# Altium footprint library My_SOMA_1806211.PcbLib: 50 footprints (part 2 of 4)
Each footprint in its own frame and in the unit in brackets; x right, y up, seen from the top. Pads: shape width x height; smd on the part's side, far side on the other; paste and mask are expansions set on the pad; w line width, h text height; cw(c..) or ccw(c..) is an arc to the next point about the centre after c.
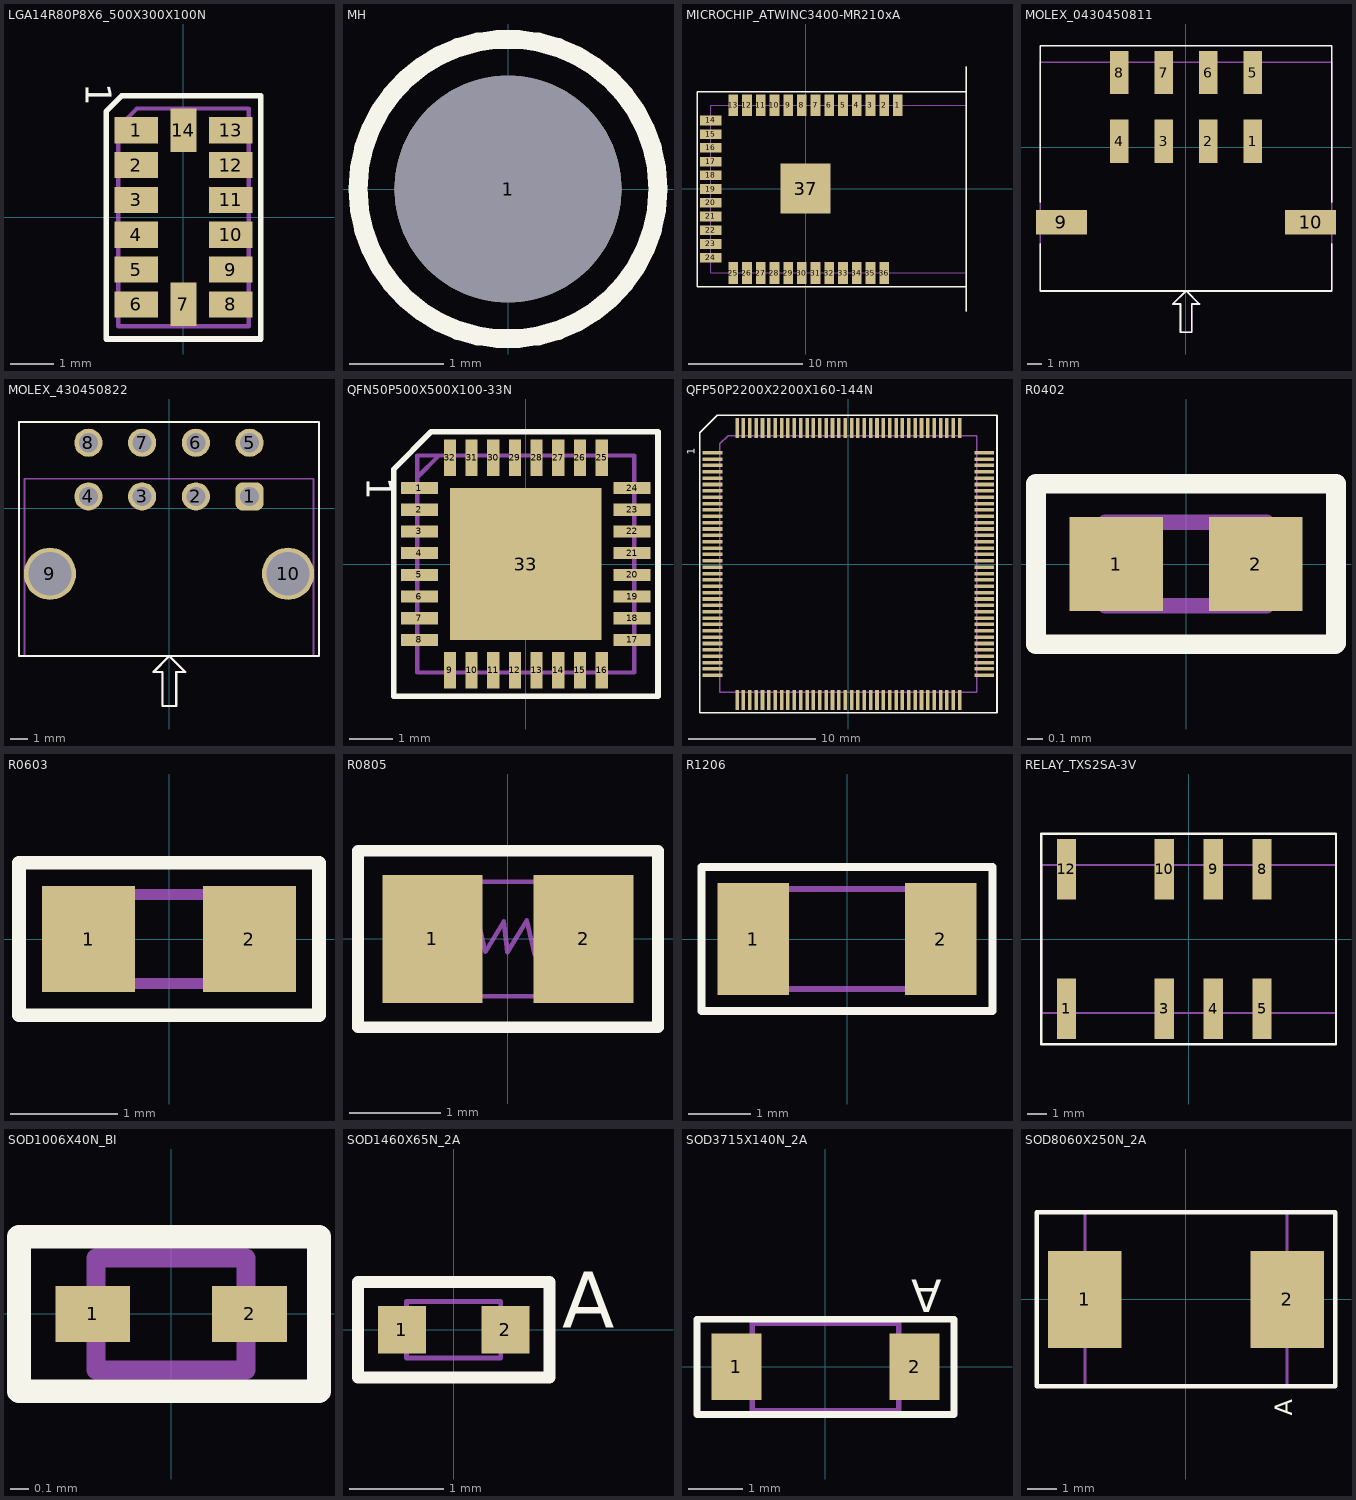
[diagram p1: the footprints below, top view; thin cyan lines are the x and y axes]

## LGA14R80P8X6_500X300X100N [mm] "ADXL343BCCZ-RL7,ACCEL 2-16G I2C/SPI 14LGA"
height 1
pads (14):
  rect 1x0.6 smd mask+0.051: 1(-1.086,2) 2(-1.086,1.2) 3(-1.086,0.4) 4(-1.086,-0.4) 5(-1.086,-1.2) 6(-1.086,-2) 8(1.086,-2) 9(1.086,-1.2) 10(1.086,-0.4) 11(1.086,0.4) 12(1.086,1.2) 13(1.086,2)
  rect 0.6x1 smd mask+0.051: 7(0,-2) 14(0,2)
Top Overlay:
  lines w0.127: -1.778,-2.794 -1.778,2.428 -1.412,2.794 1.778,2.794 1.778,-2.794 -1.778,-2.794
  text "1" at -2.442,3.08 h1.02
Mechanical 13:
  lines w0.102: -1.5,-2.5 -1.5,2.068 -1.068,2.5 1.5,2.5 1.5,-2.5 -1.5,-2.5
  text ".Designator" at -0.077,0.572 h1.02
  text "1" at -1.233,2.062 h1.02
3D body "LGA_CC-14-1_ADI.step": height 1.02, standoff 0, extent -1.625,-2.5 1.625,2.5

## MH [mm]
pads (1):
  round 2.4 hole 2.4 unplated: 1(0,0)
Top Overlay:
  circle w0.2: c0,0 r1.585
Mechanical 13:
  circle w0.102: c0,0 r1.585

## MICROCHIP_ATWINC3400-MR210xA [mm] "ATWINC3400-MR210xA"
height 2
pads (37):
  rect 0.85x1.905 smd mask+0.051: 1(8.105,7.318) 2(6.901,7.318) 3(5.697,7.318) 4(4.493,7.318) 5(3.289,7.318) 6(2.085,7.318) 7(0.881,7.318) 8(-0.323,7.318) 9(-1.527,7.318) 10(-2.731,7.318) 11(-3.935,7.318) 12(-5.139,7.318) 13(-6.343,7.318) 25(-6.343,-7.414) 26(-5.139,-7.414) 27(-3.935,-7.414) 28(-2.731,-7.414) 29(-1.527,-7.414) 30(-0.323,-7.414) 31(0.881,-7.414) 32(2.085,-7.414) 33(3.289,-7.414) 34(4.493,-7.414) 35(5.697,-7.414) 36(6.901,-7.414)
  rect 1.905x0.85 smd mask+0.051: 14(-8.328,5.974) 15(-8.328,4.77) 16(-8.328,3.566) 17(-8.328,2.362) 18(-8.328,1.158) 19(-8.328,-0.046) 20(-8.328,-1.25) 21(-8.328,-2.454) 22(-8.328,-3.658) 23(-8.328,-4.862) 24(-8.328,-6.066)
  rect 4.4x4.4 smd mask+0.051: 37(0,0)
Top Overlay:
  lines w0.127: 14.104,-10.751 14.104,-7.407 ; 14.104,7.325 14.104,10.668 ; -9.525,-8.636 -9.525,8.509 14.104,8.509 14.104,-8.636 -9.525,-8.636
Mechanical 13:
  lines w0.102: 14.104,-10.751 14.104,-7.407 ; 14.104,10.668 14.104,7.325 ; 14.104,-7.407 14.104,7.325 ; 14.104,-7.407 -8.324,-7.407 -8.324,7.325 14.104,7.325
  text "PCB EDGE" at 14.72,11.303 h1.02
  text ".Designator" at -0.975,0.539 h1.02
3D body "ATWINC3400-MR210CA131.STEP": height 2.19, standoff -0.02, extent -8.324,-7.408 14.102,7.324

## MOLEX_0430450811 [mm] "0430450811,CONN HEADER SMD R/A 8POS 3MM"
height 8
pads (10):
  rect 1.27x2.921 smd mask+0.051: 1(4.5,0.42) 2(1.5,0.42) 3(-1.5,0.42) 4(-4.5,0.42) 5(4.5,5.05) 6(1.5,5.05) 7(-1.5,5.05) 8(-4.5,5.05)
  rect 3.43x1.65 smd mask+0.051: 9(-8.395,-5.05) 10(8.395,-5.05)
Top Overlay:
  lines w0.127: -9.825,-6.507 -9.825,-9.669 9.825,-9.669 9.825,-6.507 ; -9.825,-3.671 -9.825,6.858 9.825,6.858 9.825,-3.671 ; -0.374,-10.549 -0.88,-10.549 0.009,-9.66 0.898,-10.549 0.39,-10.549 0.39,-12.454 -0.372,-12.454 -0.372,-10.549
Mechanical 13:
  lines w0.102: -0.392,-10.549 -0.898,-10.549 -0.009,-9.66 0.88,-10.549 0.372,-10.549 0.372,-12.454 -0.39,-12.454 -0.39,-10.549 ; -9.825,-9.669 9.825,-9.669 9.825,5.731 -9.825,5.731 -9.825,-9.669
  text ".Designator" at 0.618,-0.164 h1.02
3D body "430450811.stp": height 8.83, standoff 0.06, extent -9.825,-9.669 9.825,5.731

## MOLEX_430450822 [mil] "0430450822,CONN HEADER R/A 8POS 3MM"
height 346.46
pads (10):
  rrect50% 62x62 hole 42 mask+2: 1(177.17,25.98)
  round 62 hole 42 mask+2: 2(59.06,25.98) 3(-59.06,25.98) 4(-177.17,25.98) 5(177.17,144.09) 6(59.06,144.09) 7(-59.06,144.09) 8(-177.17,144.09)
  round 115 hole 95 mask+2: 9(-261.81,-144.09) 10(261.81,-144.09)
Top Overlay:
  lines w5: -14.33,-360.19 -34.26,-360.19 0.74,-325.19 35.74,-360.19 15.74,-360.19 15.74,-435.19 -14.26,-435.19 -14.26,-360.19 ; -330,-325.2 -330,190 330,190 330,-325.2 -330,-325.2
Mechanical 13:
  lines w4: -15.07,-360.2 -35,-360.2 0,-325.2 35,-360.2 15,-360.2 15,-435.2 -15,-435.2 -15,-360.2 ; -317.91,-325.2 -317.91,64.96 317.91,64.96 317.91,-325.2 -317.91,-325.2
  text ".Designator" at -27.37,-102.2 h40
3D body "430450822.stp": height 347.64, standoff -122.83, extent -318.9,-325.2 318.9,156.69

## QFN50P500X500X100-33N [mm] "SGTL5000XNAA3R2,IC AUDIO CODEC STEREO 32-QFN"
height 1
pads (33):
  rect 0.85x0.28 smd mask+0.051: 1(-2.45,1.75) 2(-2.45,1.25) 3(-2.45,0.75) 4(-2.45,0.25) 5(-2.45,-0.25) 6(-2.45,-0.75) 7(-2.45,-1.25) 8(-2.45,-1.75) 17(2.45,-1.75) 18(2.45,-1.25) 19(2.45,-0.75) 20(2.45,-0.25) 21(2.45,0.25) 22(2.45,0.75) 23(2.45,1.25) 24(2.45,1.75)
  rect 0.28x0.85 smd mask+0.051: 9(-1.75,-2.45) 10(-1.25,-2.45) 11(-0.75,-2.45) 12(-0.25,-2.45) 13(0.25,-2.45) 14(0.75,-2.45) 15(1.25,-2.45) 16(1.75,-2.45) 25(1.75,2.45) 26(1.25,2.45) 27(0.75,2.45) 28(0.25,2.45) 29(-0.25,2.45) 30(-0.75,2.45) 31(-1.25,2.45) 32(-1.75,2.45)
  rect 3.5x3.5 smd paste-4 mask+0.051: 33(0,0)
Top Overlay:
  lines w0.127: -3.048,-3.048 -3.048,2.181 -2.181,3.048 3.048,3.048 3.048,-3.048 -3.048,-3.048
  text "1" at -3.867,2.001 h1.02
Top Paste:
  rectangle: -1.6,0.711 -0.711,1.6
  rectangle: -0.457,0.711 0.432,1.6
  rectangle: 0.686,0.711 1.575,1.6
  rectangle: -1.6,-0.432 -0.711,0.457
  rectangle: -0.457,-0.432 0.432,0.457
  rectangle: 0.686,-0.432 1.575,0.457
  rectangle: -1.6,-1.575 -0.711,-0.686
  rectangle: -0.457,-1.575 0.432,-0.686
  rectangle: 0.686,-1.575 1.575,-0.686
Mechanical 13:
  lines w0.102: -2.5,2 -2,2.5 ; -2.5,-2.5 2.5,-2.5 2.5,2.5 -2.5,2.5 -2.5,-2.5
  text ".Designator" at -0.115,0.479 h1.02
  text "1" at -2.307,1.944 h1.02
  text "9" at -2.013,-1.89 h1.02
  text "17" at 1.574,-1.313 h1.02
  text "25" at 1.397,2.202 h1.02
3D body "CS42L51-CNZ.stp": height 1, standoff 0, extent -2.55,-2.55 2.55,2.55

## QFP50P2200X2200X160-144N [mm]
height 15
pads (144):
  rect 1.56x0.279 smd mask+0.051: 1(-10.68,8.75) 2(-10.68,8.25) 3(-10.68,7.75) 4(-10.68,7.25) 5(-10.68,6.75) 6(-10.68,6.25) 7(-10.68,5.75) 8(-10.68,5.25) 9(-10.68,4.75) 10(-10.68,4.25) 11(-10.68,3.75) 12(-10.68,3.25) 13(-10.68,2.75) 14(-10.68,2.25) 15(-10.68,1.75) 16(-10.68,1.25) 17(-10.68,0.75) 18(-10.68,0.25) 19(-10.68,-0.25) 20(-10.68,-0.75) 21(-10.68,-1.25) 22(-10.68,-1.75) 23(-10.68,-2.25) 24(-10.68,-2.75) 25(-10.68,-3.25) 26(-10.68,-3.75) 27(-10.68,-4.25) 28(-10.68,-4.75) 29(-10.68,-5.25) 30(-10.68,-5.75) 31(-10.68,-6.25) 32(-10.68,-6.75) 33(-10.68,-7.25) 34(-10.68,-7.75) 35(-10.68,-8.25) 36(-10.68,-8.75) 73(10.68,-8.75) 74(10.68,-8.25) 75(10.68,-7.75) 76(10.68,-7.25) 77(10.68,-6.75) 78(10.68,-6.25) 79(10.68,-5.75) 80(10.68,-5.25) 81(10.68,-4.75) 82(10.68,-4.25) 83(10.68,-3.75) 84(10.68,-3.25) 85(10.68,-2.75) 86(10.68,-2.25) 87(10.68,-1.75) 88(10.68,-1.25) 89(10.68,-0.75) 90(10.68,-0.25) 91(10.68,0.25) 92(10.68,0.75) 93(10.68,1.25) 94(10.68,1.75) 95(10.68,2.25) 96(10.68,2.75) 97(10.68,3.25) 98(10.68,3.75) 99(10.68,4.25) 100(10.68,4.75) 101(10.68,5.25) 102(10.68,5.75) 103(10.68,6.25) 104(10.68,6.75) 105(10.68,7.25) 106(10.68,7.75) 107(10.68,8.25) 108(10.68,8.75)
  rect 0.279x1.56 smd mask+0.051: 37(-8.75,-10.68) 38(-8.25,-10.68) 39(-7.75,-10.68) 40(-7.25,-10.68) 41(-6.75,-10.68) 42(-6.25,-10.68) 43(-5.75,-10.68) 44(-5.25,-10.68) 45(-4.75,-10.68) 46(-4.25,-10.68) 47(-3.75,-10.68) 48(-3.25,-10.68) 49(-2.75,-10.68) 50(-2.25,-10.68) 51(-1.75,-10.68) 52(-1.25,-10.68) 53(-0.75,-10.68) 54(-0.25,-10.68) 55(0.25,-10.68) 56(0.75,-10.68) 57(1.25,-10.68) 58(1.75,-10.68) 59(2.25,-10.68) 60(2.75,-10.68) 61(3.25,-10.68) 62(3.75,-10.68) 63(4.25,-10.68) 64(4.75,-10.68) 65(5.25,-10.68) 66(5.75,-10.68) 67(6.25,-10.68) 68(6.75,-10.68) 69(7.25,-10.68) 70(7.75,-10.68) 71(8.25,-10.68) 72(8.75,-10.68) 109(8.75,10.68) 110(8.25,10.68) 111(7.75,10.68) 112(7.25,10.68) 113(6.75,10.68) 114(6.25,10.68) 115(5.75,10.68) 116(5.25,10.68) 117(4.75,10.68) 118(4.25,10.68) 119(3.75,10.68) 120(3.25,10.68) 121(2.75,10.68) 122(2.25,10.68) 123(1.75,10.68) 124(1.25,10.68) 125(0.75,10.68) 126(0.25,10.68) 127(-0.25,10.68) 128(-0.75,10.68) 129(-1.25,10.68) 130(-1.75,10.68) 131(-2.25,10.68) 132(-2.75,10.68) 133(-3.25,10.68) 134(-3.75,10.68) 135(-4.25,10.68) 136(-4.75,10.68) 137(-5.25,10.68) 138(-5.75,10.68) 139(-6.25,10.68) 140(-6.75,10.68) 141(-7.25,10.68) 142(-7.75,10.68) 143(-8.25,10.68) 144(-8.75,10.68)
Top Overlay:
  lines w0.127: -11.684,-11.684 -11.684,10.316 -10.316,11.684 11.684,11.684 11.684,-11.684 -11.684,-11.684
  text "1" at -11.9,8.605 h1.02
Mechanical 13:
  lines w0.102: -10.1,-10.1 -10.1,9.458 -9.458,10.1 10.1,10.1 10.1,-10.1 -10.1,-10.1
  text "109" at 9.072,8.443 h1.02
  text "73" at 9.747,-9.361 h1.02
  text "37" at -8.402,-9.9 h1.02
  text "1" at -9.227,8.613 h1.02
  text ".Designator" at 0.688,-0.795 h1.02
3D body "STM32H753ZIT6.STEP": height 1.53, standoff -0.07, extent -11,-11 11,11

## R0402 [mil]
pads (2):
  rect 24x24 smd mask+2: 1(-17.83,0) 2(17.83,0)
Top Overlay:
  lines w5: -38.33,-20.5 38.1,-20.5 38.33,-20.27 38.33,20.5 -38.33,20.5 -38.33,-20.5
Mechanical 13:
  lines w4: -20.67,-10.63 20.67,-10.63 20.67,10.63 -20.67,10.63 -20.67,-10.63
  text ".Designator" at 92.7,9.63 h40
3D body "C0402.STEP": height 20.1, standoff 0, extent -19.99,-9.99 20.01,10.01

## R0603 [mil]
height 590.55
pads (2):
  rect 34x39 smd mask+2: 1(-29.48,0) 2(29.48,0)
Top Overlay:
  lines w5: -54.98,-28 -54.98,28 54.98,28 54.98,-28 -54.98,-28
Mechanical 13:
  lines w4: -31.5,-16.24 31.5,-16.24 31.5,16.24 -31.5,16.24 -31.5,-16.24
  text ".Designator" at -44.05,12.82 h40
3D body "0603_SMD.stp": height 11.89, standoff 0, extent -31.54,-15.72 31.46,15.78

## R0805 [mil] "Chip Resistor"
height 29.92
pads (2):
  rect 43x55 smd mask+2: 1(-32.5,0) 2(32.5,0)
Top Overlay:
  lines w5: 64.5,-37.98 64.5,38 -64.5,38 -64.5,-38 64.44,-38 ; 64.44,-38 64.46,-37.98
Mechanical 13:
  lines w2: -36.59,1.59 -19.72,1.59 -15.77,1.59 -12.77,7.59 -9.77,-5.41 -1.77,7.59 -0.23,-5.59 8.13,7.99 11.54,-6.78 15.37,0.87 ; 15.85,1.3 19.79,1.3 37.7,1.3 ; -39.37,-24.61 -39.37,24.61 39.37,24.61 39.37,-24.61 -39.37,-24.61
  text ".Designator" at -46,-5 h20
3D body "User Library-RES_2013-0805.STEP": height 29.92, standoff 0, extent -45.27,-26.57 45.28,26.58

## R1206 [mm]
pads (2):
  rect 1.15x1.8 smd mask+0.076: 1(-1.5,0) 2(1.5,0)
Top Overlay:
  lines w0.127: -2.329,-1.154 2.329,-1.154 2.329,1.154 -2.329,1.154 -2.329,-1.154
Mechanical 13:
  lines w0.102: -1.6,-0.8 -1.6,0.8 1.6,0.8 1.6,-0.8 -1.6,-0.8
  text ".Designator" at -0.463,-0.362 h1.02
3D body "User Library-1206 SMD Resistor.step": height 1, standoff 0, extent -1.6,-0.8 1.6,0.8

## RELAY_TXS2SA-3V [mm]
pads (8):
  rect 1x3.16 smd paste+0 mask+0.051: 1(-6.35,-3.62) 3(-1.27,-3.62) 4(1.27,-3.62) 5(3.81,-3.62) 8(3.81,3.62) 9(1.27,3.62) 10(-1.27,3.62) 12(-6.35,3.62)
Top Overlay:
  lines w0.127: -7.65,-5.461 -7.65,5.461 7.65,5.461 7.65,-5.461 -7.65,-5.461
Mechanical 13:
  lines w0.102: -7.65,-3.85 -7.65,3.85 7.65,3.85 7.65,-3.85 -7.65,-3.85
  text ".Designator" at 1.088,0.215 h1.02
3D body "Relay_Panasonic_TXS2SA-3V_eec.STEP": height 8.7, standoff 0, extent -7.5,-4.7 7.5,4.7

## SOD1006X40N_BI [mm] "ESD9B3.3ST5G,ESD9B3.3ST5G"
height 0.4
pads (2):
  rect 0.4x0.3 smd mask+0.051: 1(-0.42,0) 2(0.42,0)
Top Overlay:
  lines w0.127: -0.816,-0.415 -0.816,0.414 0.793,0.414 0.793,-0.415 -0.816,-0.415
Mechanical 13:
  lines w0.102: -0.404,-0.3 -0.404,0.3 0.4,0.3 0.4,-0.3 -0.404,-0.3
  text ".Designator" at 0.684,-0.866 h1.02
3D body "User Library-DIODE_SOD-923.step": height 0.43, standoff 0, extent -0.525,-0.325 0.525,0.325

## SOD1460X65N_2A [mil] "TVS DIODE 5VWM 12VC SOD723,SP1003-01DTG"
height 25.59
pads (2):
  rect 20x20 smd mask+2: 1(-21.65,0) 2(21.65,0)
Top Overlay:
  lines w5: -40,-20 -40,20 40,20 40,-20 -40,-20
  text "A" at 45.45,-6.85 h40
Mechanical 13:
  lines w2: -19.68,-11.81 -19.68,11.81 19.68,11.81 19.68,-11.81 -19.68,-11.81
  text "A" at 45.45,-6.85 h40
  text ".Designator" at -33.4,38.3 h40
3D body: height 25.59, standoff 0, extent -19.68,-11.81 19.68,11.81

## SOD3715X140N_2A [mil] "BAT43W-7-F,DIODE SCHOTTKY 30V 200MA SOD123"
height 55.12
pads (2):
  rect 36x48 smd mask+2: 1(-64.37,0) 2(64.37,0)
Top Overlay:
  lines w5: -92.87,-34.5 92.87,-34.5 92.87,34.5 -92.87,34.5 -92.87,-34.5
  text "A" at 83.97,71.05 h40
Mechanical 13:
  lines w4: -52.95,-31.5 -52.95,31.5 52.95,31.5 52.95,-31.5 -52.95,-31.5
  text "A" at 90.72,13.69 h40
  text ".Designator" at 25.37,12.32 h40
3D body "CircuitWorks-SOD123.step": height 50, standoff 0, extent -72.81,-31.52 72.86,31.48

## SOD8060X250N_2A [mm] "B550C-13-F,DIODE SCHOTTKY 50V 5A SMC"
height 2.5
pads (2):
  rect 2.5x3.3 smd mask+0.051: 1(-3.45,0) 2(3.45,0)
Top Overlay:
  lines w0.152: -3.427,2.953 5.08,2.953 5.08,-2.953 -5.08,-2.953 -5.08,2.953 -3.162,2.953
  text "A" at 3.813,-3.952 h1.02
Mechanical 13:
  lines w0.102: -3.162,2.953 -3.427,2.953 ; -3.427,2.953 3.427,2.953 3.427,-2.953 -3.427,-2.953 -3.427,2.953
  text "A" at 3.023,-0.307 h1.02
  text ".Designator" at -0.241,-0.464 h1.02
3D body "User Library-DO-214AB SMC.step": height 2.3, standoff 0, extent -3.975,-2.95 3.975,2.95